# Altium footprint library 布洛电子PCB封装库-通用接插件.PcbLib: 103 footprints (part 3 of 7)
Each footprint in its own frame and in the unit in brackets; x right, y up, seen from the top. Pads: shape width x height; smd on the part's side, far side on the other; paste and mask are expansions set on the pad; w line width, h text height; cw(c..) or ccw(c..) is an arc to the next point about the centre after c.
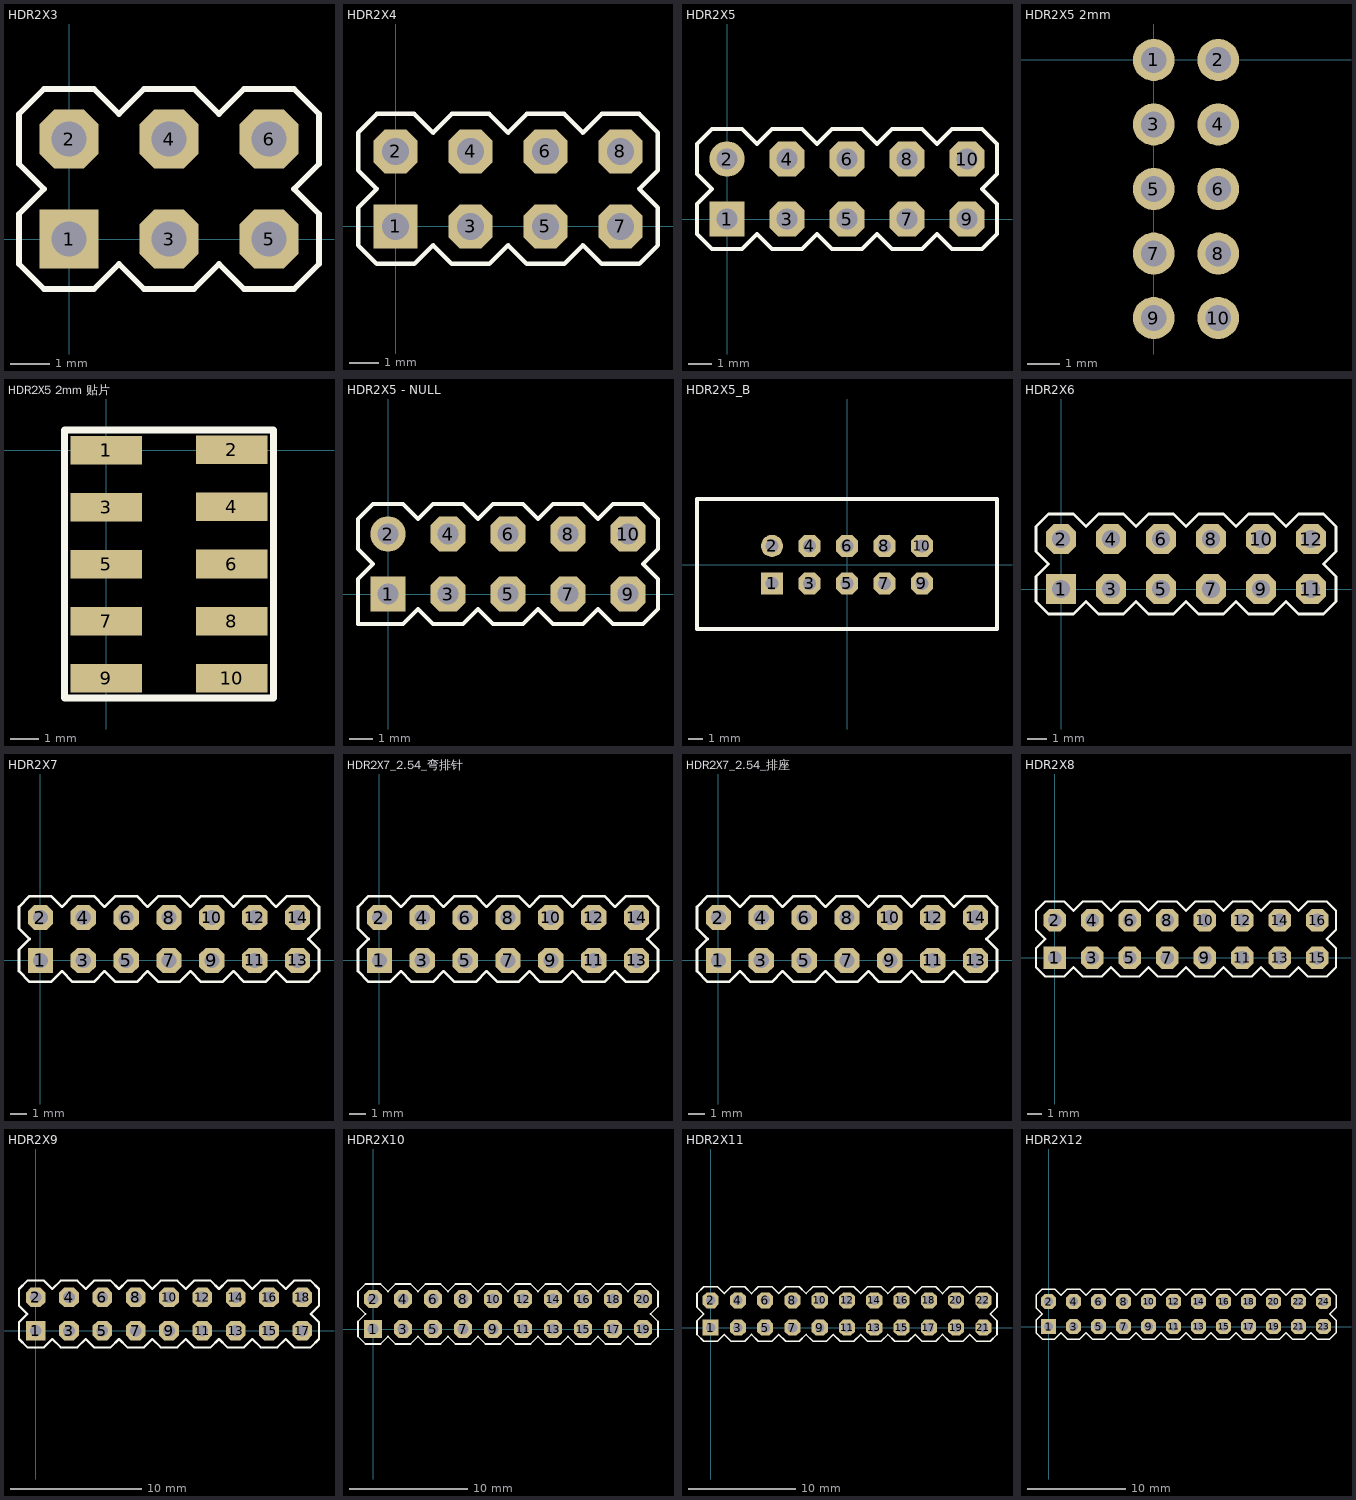
[diagram p2: the footprints below, top view; thin cyan lines are the x and y axes]

## HDR2X3 [mm] "Connector; Header; 3x2 Position"
pads (6):
  rect 1.5x1.5 hole 0.9: 1(0,0)
  oct 1.5x1.5 hole 0.9: 2(0,2.54) 3(2.54,0) 4(2.54,2.54) 5(5.08,0) 6(5.08,2.54)
Top Overlay:
  lines w0.152: -1.27,-0.635 -0.635,-1.27 0.635,-1.27 1.27,-0.635 1.905,-1.27 3.175,-1.27 3.81,-0.635 4.445,-1.27 5.715,-1.27 6.35,-0.635 6.35,0.635 5.715,1.27 6.35,1.905 6.35,3.175 5.715,3.81 4.445,3.81 3.81,3.175 3.175,3.81 1.905,3.81 1.27,3.175 0.635,3.81 -0.635,3.81 -1.27,3.175 -1.27,1.905 -0.635,1.27 -1.27,0.635 -1.27,-0.635
3D body: height 7.58, standoff -2.94, extent 1.27,1.27 3.81,3.81
3D body: height 7.58, standoff -2.94, extent -1.27,1.27 1.27,3.81
3D body: height 7.58, standoff -2.94, extent 1.27,-1.27 3.81,1.27
3D body: height 7.58, standoff -2.94, extent -1.27,-1.27 1.27,1.27
3D body: height 7.58, standoff -2.94, extent 3.81,-1.27 6.35,1.27
3D body: height 7.58, standoff -2.94, extent 3.81,1.27 6.35,3.81

## HDR2X4 [mm] "Connector; Header; 4x2 Position"
pads (8):
  rect 1.5x1.5 hole 0.9: 1(0,0)
  oct 1.5x1.5 hole 0.9: 2(0,2.54) 3(2.54,0) 4(2.54,2.54) 5(5.08,0) 6(5.08,2.54) 7(7.62,0) 8(7.62,2.54)
Top Overlay:
  lines w0.152: -1.27,-0.635 -1.27,0.635 -0.635,1.27 -1.27,1.905 -1.27,3.175 -0.635,3.81 0.635,3.81 1.27,3.175 1.905,3.81 3.175,3.81 3.81,3.175 4.445,3.81 5.715,3.81 6.35,3.175 6.985,3.81 8.255,3.81 8.89,3.175 8.89,1.905 8.255,1.27 8.89,0.635 8.89,-0.635 8.255,-1.27 6.985,-1.27 6.35,-0.635 5.715,-1.27 4.445,-1.27 3.81,-0.635 3.175,-1.27 1.905,-1.27 1.27,-0.635 0.635,-1.27 -0.635,-1.27 -1.27,-0.635
3D body: height 7.58, standoff -2.94, extent 3.81,1.27 6.35,3.81
3D body: height 7.58, standoff -2.94, extent 3.81,-1.27 6.35,1.27
3D body: height 7.58, standoff -2.94, extent -1.27,-1.27 1.27,1.27
3D body: height 7.58, standoff -2.94, extent 1.27,-1.27 3.81,1.27
3D body: height 7.58, standoff -2.94, extent -1.27,1.27 1.27,3.81
3D body: height 7.58, standoff -2.94, extent 1.27,1.27 3.81,3.81
3D body: height 7.58, standoff -2.94, extent 6.35,-1.27 8.89,1.27
3D body: height 7.58, standoff -2.94, extent 6.35,1.27 8.89,3.81

## HDR2X5 [mm] "Connector; Header; 5x2 Position"
pads (10):
  rect 1.5x1.5 hole 0.9: 1(0,0)
  round 1.5 hole 0.9: 2(0,2.54)
  oct 1.5x1.5 hole 0.9: 3(2.54,0) 4(2.54,2.54) 5(5.08,0) 6(5.08,2.54) 7(7.62,0) 8(7.62,2.54) 9(10.16,0) 10(10.16,2.54)
Top Overlay:
  lines w0.152: -1.27,-0.635 -0.635,-1.27 0.635,-1.27 1.27,-0.635 1.905,-1.27 3.175,-1.27 3.81,-0.635 4.445,-1.27 5.715,-1.27 6.35,-0.635 6.985,-1.27 8.255,-1.27 8.89,-0.635 9.525,-1.27 10.795,-1.27 11.43,-0.635 11.43,0.635 10.795,1.27 11.43,1.905 11.43,2.54 11.43,3.175 10.795,3.81 9.525,3.81 8.89,3.175 8.255,3.81 6.985,3.81 6.35,3.175 5.715,3.81 4.445,3.81 3.81,3.175 3.175,3.81 1.905,3.81 1.27,3.175 0.635,3.81 -0.635,3.81 -1.27,3.175 -1.27,1.905 -0.635,1.27 -1.27,0.635 -1.27,-0.635
3D body: height 7.58, standoff -2.94, extent 8.89,1.27 11.43,3.81
3D body: height 7.58, standoff -2.94, extent 8.89,-1.27 11.43,1.27
3D body: height 7.58, standoff -2.94, extent 6.35,1.27 8.89,3.81
3D body: height 7.58, standoff -2.94, extent 6.35,-1.27 8.89,1.27
3D body: height 7.58, standoff -2.94, extent 3.81,1.27 6.35,3.81
3D body: height 7.58, standoff -2.94, extent 3.81,-1.27 6.35,1.27
3D body: height 7.58, standoff -2.94, extent 1.27,1.27 3.81,3.81
3D body: height 7.58, standoff -2.94, extent 1.27,-1.27 3.81,1.27
3D body: height 7.58, standoff -2.94, extent -1.27,1.27 1.27,3.81
3D body: height 7.58, standoff -2.94, extent -1.27,-1.27 1.27,1.27

## HDR2X5 2mm [mm]
pads (10):
  round 1.3 hole 0.8: 1(0,0) 2(2,0) 3(0,-2) 4(2,-2) 5(0,-4) 6(2,-4) 7(0,-6) 8(2,-6) 9(0,-8) 10(2,-8)
3D body: height 6, standoff -2.8, extent -0.952,-9.014 3.048,0.886

## HDR2X5 2mm 贴片 [mm]
pads (11):
  rect 2.5x1 smd: 1(0,0) 1(0,0) 2(4.394,0.025) 3(0,-2) 4(4.394,-1.981) 5(0,-4) 6(4.394,-3.987) 7(0,-6) 8(4.394,-5.994) 9(0,-8) 10(4.394,-8)
Top Overlay:
  lines w0.254: -1.473,-8.687 -1.473,0.711 5.867,0.711 5.867,-8.687 -1.473,-8.687

## HDR2X5 - NULL [mm] "Connector; Header; 5x2 Position"
pads (10):
  rect 1.5x1.5 hole 0.9: 1(0,0)
  round 1.5 hole 0.9: 2(0,2.54)
  oct 1.5x1.5 hole 0.9: 3(2.54,0) 4(2.54,2.54) 5(5.08,0) 6(5.08,2.54) 7(7.62,0) 8(7.62,2.54) 9(10.16,0) 10(10.16,2.54)
Top Overlay:
  lines w0.152: -1.27,-1.27 -1.27,0.635 -0.635,1.27 -1.27,1.905 -1.27,3.175 -0.635,3.81 0.635,3.81 1.27,3.175 1.905,3.81 3.175,3.81 3.81,3.175 4.445,3.81 5.715,3.81 6.35,3.175 6.985,3.81 8.255,3.81 8.89,3.175 9.525,3.81 10.795,3.81 11.43,3.175 11.43,2.54 11.43,1.905 10.795,1.27 11.43,0.635 11.43,-0.635 10.795,-1.27 9.525,-1.27 8.89,-0.635 8.255,-1.27 6.985,-1.27 6.35,-0.635 5.715,-1.27 4.445,-1.27 3.81,-0.635 3.175,-1.27 1.905,-1.27 1.27,-0.635 0.635,-1.27 -1.27,-1.27

## HDR2X5_B [mm]
pads (10):
  rect 1.5x1.5 hole 0.9: 1(-5.08,-1.27)
  round 1.5 hole 0.9: 2(-5.08,1.27)
  oct 1.5x1.5 hole 0.9: 3(-2.54,-1.27) 4(-2.54,1.27) 5(0,-1.27) 6(0,1.27) 7(2.54,-1.27) 8(2.54,1.27) 9(5.08,-1.27) 10(5.08,1.27)
Top Overlay:
  lines w0.254: -10.16,-4.355 -10.16,4.445 10.16,4.445 10.16,-4.355 -10.16,-4.355
3D body: height 9.2, standoff -3.3, extent -10.16,-4.355 10.16,4.445

## HDR2X6 [mm] "Connector; Header; 6x2 Position"
pads (12):
  rect 1.5x1.5 hole 0.9: 1(0,0)
  oct 1.5x1.5 hole 0.9: 2(0,2.54) 3(2.54,0) 4(2.54,2.54) 5(5.08,0) 6(5.08,2.54) 7(7.62,0) 8(7.62,2.54) 9(10.16,0) 10(10.16,2.54) 11(12.7,0) 12(12.7,2.54)
Top Overlay:
  lines w0.152: -1.27,-0.635 -0.635,-1.27 0.635,-1.27 1.27,-0.635 1.905,-1.27 3.175,-1.27 3.81,-0.635 4.445,-1.27 5.715,-1.27 6.35,-0.635 6.985,-1.27 8.255,-1.27 8.89,-0.635 9.525,-1.27 10.795,-1.27 11.43,-0.635 12.065,-1.27 13.335,-1.27 13.97,-0.635 13.97,0.635 13.335,1.27 13.97,1.905 13.97,3.175 13.335,3.81 12.065,3.81 11.43,3.175 10.795,3.81 9.525,3.81 8.89,3.175 8.255,3.81 6.985,3.81 6.35,3.175 5.715,3.81 4.445,3.81 3.81,3.175 3.175,3.81 1.905,3.81 1.27,3.175 0.635,3.81 -0.635,3.81 -1.27,3.175 -1.27,1.905 -0.635,1.27 -1.27,0.635 -1.27,-0.635
3D body: height 7.58, standoff -2.94, extent 11.43,1.27 13.97,3.81
3D body: height 7.58, standoff -2.94, extent 11.43,-1.27 13.97,1.27
3D body: height 7.58, standoff -2.94, extent 8.89,1.27 11.43,3.81
3D body: height 7.58, standoff -2.94, extent 8.89,-1.27 11.43,1.27
3D body: height 7.58, standoff -2.94, extent 6.35,1.27 8.89,3.81
3D body: height 7.58, standoff -2.94, extent 6.35,-1.27 8.89,1.27
3D body: height 7.58, standoff -2.94, extent 3.81,1.27 6.35,3.81
3D body: height 7.58, standoff -2.94, extent 3.81,-1.27 6.35,1.27
3D body: height 7.58, standoff -2.94, extent 1.27,1.27 3.81,3.81
3D body: height 7.58, standoff -2.94, extent 1.27,-1.27 3.81,1.27
3D body: height 7.58, standoff -2.94, extent -1.27,1.27 1.27,3.81
3D body: height 7.58, standoff -2.94, extent -1.27,-1.27 1.27,1.27

## HDR2X7 [mm] "Connector; Header; 7x2 Position"
pads (14):
  rect 1.5x1.5 hole 0.9: 1(0,0)
  oct 1.5x1.5 hole 0.9: 2(0,2.54) 3(2.54,0) 4(2.54,2.54) 5(5.08,0) 6(5.08,2.54) 7(7.62,0) 8(7.62,2.54) 9(10.16,0) 10(10.16,2.54) 11(12.7,0) 12(12.7,2.54) 13(15.24,0) 14(15.24,2.54)
Top Overlay:
  lines w0.152: -1.27,-0.635 -0.635,-1.27 0.635,-1.27 1.27,-0.635 1.905,-1.27 3.175,-1.27 3.81,-0.635 4.445,-1.27 5.715,-1.27 6.35,-0.635 6.985,-1.27 8.255,-1.27 8.89,-0.635 9.525,-1.27 10.795,-1.27 11.43,-0.635 12.065,-1.27 13.335,-1.27 13.97,-0.635 14.605,-1.27 15.875,-1.27 16.51,-0.635 16.51,0.635 15.875,1.27 16.51,1.905 16.51,3.175 15.875,3.81 14.605,3.81 13.97,3.175 13.335,3.81 12.065,3.81 11.43,3.175 10.795,3.81 9.525,3.81 8.89,3.175 8.255,3.81 6.985,3.81 6.35,3.175 5.715,3.81 4.445,3.81 3.81,3.175 3.175,3.81 1.905,3.81 1.27,3.175 0.635,3.81 -0.635,3.81 -1.27,3.175 -1.27,1.905 -0.635,1.27 -1.27,0.635 -1.27,-0.635
3D body: height 7.58, standoff -2.94, extent 13.97,1.27 16.51,3.81
3D body: height 7.58, standoff -2.94, extent 13.97,-1.27 16.51,1.27
3D body: height 7.58, standoff -2.94, extent 11.43,1.27 13.97,3.81
3D body: height 7.58, standoff -2.94, extent 11.43,-1.27 13.97,1.27
3D body: height 7.58, standoff -2.94, extent 8.89,1.27 11.43,3.81
3D body: height 7.58, standoff -2.94, extent 8.89,-1.27 11.43,1.27
3D body: height 7.58, standoff -2.94, extent 6.35,1.27 8.89,3.81
3D body: height 7.58, standoff -2.94, extent 6.35,-1.27 8.89,1.27
3D body: height 7.58, standoff -2.94, extent 3.81,1.27 6.35,3.81
3D body: height 7.58, standoff -2.94, extent 3.81,-1.27 6.35,1.27
3D body: height 7.58, standoff -2.94, extent 1.27,1.27 3.81,3.81
3D body: height 7.58, standoff -2.94, extent 1.27,-1.27 3.81,1.27
3D body: height 7.58, standoff -2.94, extent -1.27,1.27 1.27,3.81
3D body: height 7.58, standoff -2.94, extent -1.27,-1.27 1.27,1.27

## HDR2X7_2.54_弯排针 [mm]
pads (14):
  rect 1.5x1.5 hole 0.9: 1(0,0)
  oct 1.5x1.5 hole 0.9: 2(0,2.54) 3(2.54,0) 4(2.54,2.54) 5(5.08,0) 6(5.08,2.54) 7(7.62,0) 8(7.62,2.54) 9(10.16,0) 10(10.16,2.54) 11(12.7,0) 12(12.7,2.54) 13(15.24,0) 14(15.24,2.54)
Top Overlay:
  lines w0.152: -1.27,-0.635 -1.27,0.635 -0.635,1.27 -1.27,1.905 -1.27,3.175 -0.635,3.81 0.635,3.81 1.27,3.175 1.905,3.81 3.175,3.81 3.81,3.175 4.445,3.81 5.715,3.81 6.35,3.175 6.985,3.81 8.255,3.81 8.89,3.175 9.525,3.81 10.795,3.81 11.43,3.175 12.065,3.81 13.335,3.81 13.97,3.175 14.605,3.81 15.875,3.81 16.51,3.175 16.51,1.905 15.875,1.27 16.51,0.635 16.51,-0.635 15.875,-1.27 14.605,-1.27 13.97,-0.635 13.335,-1.27 12.065,-1.27 11.43,-0.635 10.795,-1.27 9.525,-1.27 8.89,-0.635 8.255,-1.27 6.985,-1.27 6.35,-0.635 5.715,-1.27 4.445,-1.27 3.81,-0.635 3.175,-1.27 1.905,-1.27 1.27,-0.635 0.635,-1.27 -0.635,-1.27 -1.27,-0.635
3D body: height 5.7, standoff -3.07, extent -1.245,-10.485 16.535,2.87

## HDR2X7_2.54_排座 [mm]
pads (14):
  rect 1.5x1.5 hole 0.9: 1(0,0)
  oct 1.5x1.5 hole 0.9: 2(0,2.54) 3(2.54,0) 4(2.54,2.54) 5(5.08,0) 6(5.08,2.54) 7(7.62,0) 8(7.62,2.54) 9(10.16,0) 10(10.16,2.54) 11(12.7,0) 12(12.7,2.54) 13(15.24,0) 14(15.24,2.54)
Top Overlay:
  lines w0.152: -1.27,-0.635 -1.27,0.635 -0.635,1.27 -1.27,1.905 -1.27,3.175 -0.635,3.81 0.635,3.81 1.27,3.175 1.905,3.81 3.175,3.81 3.81,3.175 4.445,3.81 5.715,3.81 6.35,3.175 6.985,3.81 8.255,3.81 8.89,3.175 9.525,3.81 10.795,3.81 11.43,3.175 12.065,3.81 13.335,3.81 13.97,3.175 14.605,3.81 15.875,3.81 16.51,3.175 16.51,1.905 15.875,1.27 16.51,0.635 16.51,-0.635 15.875,-1.27 14.605,-1.27 13.97,-0.635 13.335,-1.27 12.065,-1.27 11.43,-0.635 10.795,-1.27 9.525,-1.27 8.89,-0.635 8.255,-1.27 6.985,-1.27 6.35,-0.635 5.715,-1.27 4.445,-1.27 3.81,-0.635 3.175,-1.27 1.905,-1.27 1.27,-0.635 0.635,-1.27 -0.635,-1.27 -1.27,-0.635
3D body: height 8.5, standoff -3.2, extent -1.393,-1.23 16.637,3.77

## HDR2X8 [mm] "Connector; Header; 8x2 Position"
pads (16):
  rect 1.5x1.5 hole 0.9: 1(0,0)
  oct 1.5x1.5 hole 0.9: 2(0,2.54) 3(2.54,0) 4(2.54,2.54) 5(5.08,0) 6(5.08,2.54) 7(7.62,0) 8(7.62,2.54) 9(10.16,0) 10(10.16,2.54) 11(12.7,0) 12(12.7,2.54) 13(15.24,0) 14(15.24,2.54) 15(17.78,0) 16(17.78,2.54)
Top Overlay:
  lines w0.152: -1.27,-0.635 -1.27,0.635 -0.635,1.27 -1.27,1.905 -1.27,3.175 -0.635,3.81 0.635,3.81 1.27,3.175 1.905,3.81 3.175,3.81 3.81,3.175 4.445,3.81 5.715,3.81 6.35,3.175 6.985,3.81 8.255,3.81 8.89,3.175 9.525,3.81 10.795,3.81 11.43,3.175 12.065,3.81 13.335,3.81 13.97,3.175 14.605,3.81 15.875,3.81 16.51,3.175 17.145,3.81 18.415,3.81 19.05,3.175 19.05,1.905 18.415,1.27 19.05,0.635 19.05,-0.635 18.415,-1.27 17.145,-1.27 16.51,-0.635 15.875,-1.27 14.605,-1.27 13.97,-0.635 13.335,-1.27 12.065,-1.27 11.43,-0.635 10.795,-1.27 9.525,-1.27 8.89,-0.635 8.255,-1.27 6.985,-1.27 6.35,-0.635 5.715,-1.27 4.445,-1.27 3.81,-0.635 3.175,-1.27 1.905,-1.27 1.27,-0.635 0.635,-1.27 -0.635,-1.27 -1.27,-0.635
3D body: height 7.58, standoff -2.94, extent -1.27,-1.27 1.27,1.27
3D body: height 7.58, standoff -2.94, extent -1.27,1.27 1.27,3.81
3D body: height 7.58, standoff -2.94, extent 1.27,-1.27 3.81,1.27
3D body: height 7.58, standoff -2.94, extent 1.27,1.27 3.81,3.81
3D body: height 7.58, standoff -2.94, extent 3.81,-1.27 6.35,1.27
3D body: height 7.58, standoff -2.94, extent 3.81,1.27 6.35,3.81
3D body: height 7.58, standoff -2.94, extent 6.35,-1.27 8.89,1.27
3D body: height 7.58, standoff -2.94, extent 6.35,1.27 8.89,3.81
3D body: height 7.58, standoff -2.94, extent 8.89,-1.27 11.43,1.27
3D body: height 7.58, standoff -2.94, extent 8.89,1.27 11.43,3.81
3D body: height 7.58, standoff -2.94, extent 11.43,-1.27 13.97,1.27
3D body: height 7.58, standoff -2.94, extent 11.43,1.27 13.97,3.81
3D body: height 7.58, standoff -2.94, extent 13.97,-1.27 16.51,1.27
3D body: height 7.58, standoff -2.94, extent 13.97,1.27 16.51,3.81
3D body: height 7.58, standoff -2.94, extent 16.51,-1.27 19.05,1.27
3D body: height 7.58, standoff -2.94, extent 16.51,1.27 19.05,3.81

## HDR2X9 [mm] "Connector; Header; 9x2 Position"
pads (18):
  rect 1.5x1.5 hole 0.9: 1(0,0)
  oct 1.5x1.5 hole 0.9: 2(0,2.54) 3(2.54,0) 4(2.54,2.54) 5(5.08,0) 6(5.08,2.54) 7(7.62,0) 8(7.62,2.54) 9(10.16,0) 10(10.16,2.54) 11(12.7,0) 12(12.7,2.54) 13(15.24,0) 14(15.24,2.54) 15(17.78,0) 16(17.78,2.54) 17(20.32,0) 18(20.32,2.54)
Top Overlay:
  lines w0.152: -1.27,-0.635 -0.635,-1.27 0.635,-1.27 1.27,-0.635 1.905,-1.27 3.175,-1.27 3.81,-0.635 4.445,-1.27 5.715,-1.27 6.35,-0.635 6.985,-1.27 8.255,-1.27 8.89,-0.635 9.525,-1.27 10.795,-1.27 11.43,-0.635 12.065,-1.27 13.335,-1.27 13.97,-0.635 14.605,-1.27 15.875,-1.27 16.51,-0.635 17.145,-1.27 18.415,-1.27 19.05,-0.635 19.685,-1.27 20.955,-1.27 21.59,-0.635 21.59,0.635 20.955,1.27 21.59,1.905 21.59,3.175 20.955,3.81 19.685,3.81 19.05,3.175 18.415,3.81 17.145,3.81 16.51,3.175 15.875,3.81 14.605,3.81 13.97,3.175 13.335,3.81 12.065,3.81 11.43,3.175 10.795,3.81 9.525,3.81 8.89,3.175 8.255,3.81 6.985,3.81 6.35,3.175 5.715,3.81 4.445,3.81 3.81,3.175 3.175,3.81 1.905,3.81 1.27,3.175 0.635,3.81 -0.635,3.81 -1.27,3.175 -1.27,1.905 -0.635,1.27 -1.27,0.635 -1.27,-0.635
3D body: height 7.58, standoff -2.94, extent -1.27,1.27 1.27,3.81
3D body: height 7.58, standoff -2.94, extent -1.27,-1.27 1.27,1.27
3D body: height 7.58, standoff -2.94, extent 1.27,1.27 3.81,3.81
3D body: height 7.58, standoff -2.94, extent 1.27,-1.27 3.81,1.27
3D body: height 7.58, standoff -2.94, extent 3.81,1.27 6.35,3.81
3D body: height 7.58, standoff -2.94, extent 3.81,-1.27 6.35,1.27
3D body: height 7.58, standoff -2.94, extent 6.35,1.27 8.89,3.81
3D body: height 7.58, standoff -2.94, extent 6.35,-1.27 8.89,1.27
3D body: height 7.58, standoff -2.94, extent 8.89,1.27 11.43,3.81
3D body: height 7.58, standoff -2.94, extent 8.89,-1.27 11.43,1.27
3D body: height 7.58, standoff -2.94, extent 11.43,1.27 13.97,3.81
3D body: height 7.58, standoff -2.94, extent 11.43,-1.27 13.97,1.27
3D body: height 7.58, standoff -2.94, extent 13.97,1.27 16.51,3.81
3D body: height 7.58, standoff -2.94, extent 13.97,-1.27 16.51,1.27
3D body: height 7.58, standoff -2.94, extent 16.51,1.27 19.05,3.81
3D body: height 7.58, standoff -2.94, extent 16.51,-1.27 19.05,1.27
3D body: height 7.58, standoff -2.94, extent 19.05,1.27 21.59,3.81
3D body: height 7.58, standoff -2.94, extent 19.05,-1.27 21.59,1.27

## HDR2X10 [mm] "Connector; Header; 10x2 Position"
pads (20):
  rect 1.5x1.5 hole 0.9: 1(0,0)
  oct 1.5x1.5 hole 0.9: 2(0,2.54) 3(2.54,0) 4(2.54,2.54) 5(5.08,0) 6(5.08,2.54) 7(7.62,0) 8(7.62,2.54) 9(10.16,0) 10(10.16,2.54) 11(12.7,0) 12(12.7,2.54) 13(15.24,0) 14(15.24,2.54) 15(17.78,0) 16(17.78,2.54) 17(20.32,0) 18(20.32,2.54) 19(22.86,0) 20(22.86,2.54)
Top Overlay:
  lines w0.152: -1.27,-0.635 -1.27,0.635 -0.635,1.27 -1.27,1.905 -1.27,3.175 -0.635,3.81 0.635,3.81 1.27,3.175 1.905,3.81 3.175,3.81 3.81,3.175 4.445,3.81 5.715,3.81 6.35,3.175 6.985,3.81 8.255,3.81 8.89,3.175 9.525,3.81 10.795,3.81 11.43,3.175 12.065,3.81 13.335,3.81 13.97,3.175 14.605,3.81 15.875,3.81 16.51,3.175 17.145,3.81 18.415,3.81 19.05,3.175 19.685,3.81 20.955,3.81 21.59,3.175 22.225,3.81 23.495,3.81 24.13,3.175 24.13,1.905 23.495,1.27 24.13,0.635 24.13,-0.635 23.495,-1.27 22.225,-1.27 21.59,-0.635 20.955,-1.27 19.685,-1.27 19.05,-0.635 18.415,-1.27 17.145,-1.27 16.51,-0.635 15.875,-1.27 14.605,-1.27 13.97,-0.635 13.335,-1.27 12.065,-1.27 11.43,-0.635 10.795,-1.27 9.525,-1.27 8.89,-0.635 8.255,-1.27 6.985,-1.27 6.35,-0.635 5.715,-1.27 4.445,-1.27 3.81,-0.635 3.175,-1.27 1.905,-1.27 1.27,-0.635 0.635,-1.27 -0.635,-1.27 -1.27,-0.635
3D body: height 7.58, standoff -2.94, extent -1.27,-1.27 1.27,1.27
3D body: height 7.58, standoff -2.94, extent -1.27,1.27 1.27,3.81
3D body: height 7.58, standoff -2.94, extent 1.27,-1.27 3.81,1.27
3D body: height 7.58, standoff -2.94, extent 1.27,1.27 3.81,3.81
3D body: height 7.58, standoff -2.94, extent 3.81,-1.27 6.35,1.27
3D body: height 7.58, standoff -2.94, extent 3.81,1.27 6.35,3.81
3D body: height 7.58, standoff -2.94, extent 6.35,-1.27 8.89,1.27
3D body: height 7.58, standoff -2.94, extent 6.35,1.27 8.89,3.81
3D body: height 7.58, standoff -2.94, extent 8.89,-1.27 11.43,1.27
3D body: height 7.58, standoff -2.94, extent 8.89,1.27 11.43,3.81
3D body: height 7.58, standoff -2.94, extent 11.43,-1.27 13.97,1.27
3D body: height 7.58, standoff -2.94, extent 11.43,1.27 13.97,3.81
3D body: height 7.58, standoff -2.94, extent 13.97,-1.27 16.51,1.27
3D body: height 7.58, standoff -2.94, extent 13.97,1.27 16.51,3.81
3D body: height 7.58, standoff -2.94, extent 16.51,-1.27 19.05,1.27
3D body: height 7.58, standoff -2.94, extent 16.51,1.27 19.05,3.81
3D body: height 7.58, standoff -2.94, extent 19.05,-1.27 21.59,1.27
3D body: height 7.58, standoff -2.94, extent 19.05,1.27 21.59,3.81
3D body: height 7.58, standoff -2.94, extent 21.59,-1.27 24.13,1.27
3D body: height 7.58, standoff -2.94, extent 21.59,1.27 24.13,3.81

## HDR2X11 [mm] "Connector; Header; 11x2 Position"
pads (22):
  rect 1.5x1.5 hole 0.9: 1(0,0)
  oct 1.5x1.5 hole 0.9: 2(0,2.54) 3(2.54,0) 4(2.54,2.54) 5(5.08,0) 6(5.08,2.54) 7(7.62,0) 8(7.62,2.54) 9(10.16,0) 10(10.16,2.54) 11(12.7,0) 12(12.7,2.54) 13(15.24,0) 14(15.24,2.54) 15(17.78,0) 16(17.78,2.54) 17(20.32,0) 18(20.32,2.54) 19(22.86,0) 20(22.86,2.54) 21(25.4,0) 22(25.4,2.54)
Top Overlay:
  lines w0.152: -1.27,-0.635 -1.27,0.635 -0.635,1.27 -1.27,1.905 -1.27,3.175 -0.635,3.81 0.635,3.81 1.27,3.175 1.905,3.81 3.175,3.81 3.81,3.175 4.445,3.81 5.715,3.81 6.35,3.175 6.985,3.81 8.255,3.81 8.89,3.175 9.525,3.81 10.795,3.81 11.43,3.175 12.065,3.81 13.335,3.81 13.97,3.175 14.605,3.81 15.875,3.81 16.51,3.175 17.145,3.81 18.415,3.81 19.05,3.175 19.685,3.81 20.955,3.81 21.59,3.175 22.225,3.81 23.495,3.81 24.13,3.175 24.765,3.81 26.035,3.81 26.67,3.175 26.67,1.905 26.035,1.27 26.67,0.635 26.67,-0.635 26.035,-1.27 24.765,-1.27 24.13,-0.635 23.495,-1.27 22.225,-1.27 21.59,-0.635 20.955,-1.27 19.685,-1.27 19.05,-0.635 18.415,-1.27 17.145,-1.27 16.51,-0.635 15.875,-1.27 14.605,-1.27 13.97,-0.635 13.335,-1.27 12.065,-1.27 11.43,-0.635 10.795,-1.27 9.525,-1.27 8.89,-0.635 8.255,-1.27 6.985,-1.27 6.35,-0.635 5.715,-1.27 4.445,-1.27 3.81,-0.635 3.175,-1.27 1.905,-1.27 1.27,-0.635 0.635,-1.27 -0.635,-1.27 -1.27,-0.635
3D body: height 7.58, standoff -2.94, extent 24.13,1.27 26.67,3.81
3D body: height 7.58, standoff -2.94, extent 24.13,-1.27 26.67,1.27
3D body: height 7.58, standoff -2.94, extent 21.59,1.27 24.13,3.81
3D body: height 7.58, standoff -2.94, extent 21.59,-1.27 24.13,1.27
3D body: height 7.58, standoff -2.94, extent 19.05,1.27 21.59,3.81
3D body: height 7.58, standoff -2.94, extent 19.05,-1.27 21.59,1.27
3D body: height 7.58, standoff -2.94, extent 16.51,1.27 19.05,3.81
3D body: height 7.58, standoff -2.94, extent 16.51,-1.27 19.05,1.27
3D body: height 7.58, standoff -2.94, extent 13.97,1.27 16.51,3.81
3D body: height 7.58, standoff -2.94, extent 13.97,-1.27 16.51,1.27
3D body: height 7.58, standoff -2.94, extent 11.43,1.27 13.97,3.81
3D body: height 7.58, standoff -2.94, extent 11.43,-1.27 13.97,1.27
3D body: height 7.58, standoff -2.94, extent 8.89,1.27 11.43,3.81
3D body: height 7.58, standoff -2.94, extent 8.89,-1.27 11.43,1.27
3D body: height 7.58, standoff -2.94, extent 6.35,1.27 8.89,3.81
3D body: height 7.58, standoff -2.94, extent 6.35,-1.27 8.89,1.27
3D body: height 7.58, standoff -2.94, extent 3.81,1.27 6.35,3.81
3D body: height 7.58, standoff -2.94, extent 3.81,-1.27 6.35,1.27
3D body: height 7.58, standoff -2.94, extent 1.27,1.27 3.81,3.81
3D body: height 7.58, standoff -2.94, extent 1.27,-1.27 3.81,1.27
3D body: height 7.58, standoff -2.94, extent -1.27,1.27 1.27,3.81
3D body: height 7.58, standoff -2.94, extent -1.27,-1.27 1.27,1.27

## HDR2X12 [mm] "Connector; Header; 12x2 Position"
pads (24):
  rect 1.5x1.5 hole 0.9: 1(0,0)
  oct 1.5x1.5 hole 0.9: 2(0,2.54) 3(2.54,0) 4(2.54,2.54) 5(5.08,0) 6(5.08,2.54) 7(7.62,0) 8(7.62,2.54) 9(10.16,0) 10(10.16,2.54) 11(12.7,0) 12(12.7,2.54) 13(15.24,0) 14(15.24,2.54) 15(17.78,0) 16(17.78,2.54) 17(20.32,0) 18(20.32,2.54) 19(22.86,0) 20(22.86,2.54) 21(25.4,0) 22(25.4,2.54) 23(27.94,0) 24(27.94,2.54)
Top Overlay:
  lines w0.152: -1.27,-0.635 -1.27,0.635 -0.635,1.27 -1.27,1.905 -1.27,3.175 -0.635,3.81 0.635,3.81 1.27,3.175 1.905,3.81 3.175,3.81 3.81,3.175 4.445,3.81 5.715,3.81 6.35,3.175 6.985,3.81 8.255,3.81 8.89,3.175 9.525,3.81 10.795,3.81 11.43,3.175 12.065,3.81 13.335,3.81 13.97,3.175 14.605,3.81 15.875,3.81 16.51,3.175 17.145,3.81 18.415,3.81 19.05,3.175 19.685,3.81 20.955,3.81 21.59,3.175 22.225,3.81 23.495,3.81 24.13,3.175 24.765,3.81 26.035,3.81 26.67,3.175 27.305,3.81 28.575,3.81 29.21,3.175 29.21,1.905 28.575,1.27 29.21,0.635 29.21,-0.635 28.575,-1.27 27.305,-1.27 26.67,-0.635 26.035,-1.27 24.765,-1.27 24.13,-0.635 23.495,-1.27 22.225,-1.27 21.59,-0.635 20.955,-1.27 19.685,-1.27 19.05,-0.635 18.415,-1.27 17.145,-1.27 16.51,-0.635 15.875,-1.27 14.605,-1.27 13.97,-0.635 13.335,-1.27 12.065,-1.27 11.43,-0.635 10.795,-1.27 9.525,-1.27 8.89,-0.635 8.255,-1.27 6.985,-1.27 6.35,-0.635 5.715,-1.27 4.445,-1.27 3.81,-0.635 3.175,-1.27 1.905,-1.27 1.27,-0.635 0.635,-1.27 -0.635,-1.27 -1.27,-0.635
3D body: height 7.58, standoff -2.94, extent -1.27,-1.27 1.27,1.27
3D body: height 7.58, standoff -2.94, extent -1.27,1.27 1.27,3.81
3D body: height 7.58, standoff -2.94, extent 1.27,-1.27 3.81,1.27
3D body: height 7.58, standoff -2.94, extent 1.27,1.27 3.81,3.81
3D body: height 7.58, standoff -2.94, extent 3.81,-1.27 6.35,1.27
3D body: height 7.58, standoff -2.94, extent 3.81,1.27 6.35,3.81
3D body: height 7.58, standoff -2.94, extent 6.35,-1.27 8.89,1.27
3D body: height 7.58, standoff -2.94, extent 6.35,1.27 8.89,3.81
3D body: height 7.58, standoff -2.94, extent 8.89,-1.27 11.43,1.27
3D body: height 7.58, standoff -2.94, extent 8.89,1.27 11.43,3.81
3D body: height 7.58, standoff -2.94, extent 11.43,-1.27 13.97,1.27
3D body: height 7.58, standoff -2.94, extent 11.43,1.27 13.97,3.81
3D body: height 7.58, standoff -2.94, extent 13.97,-1.27 16.51,1.27
3D body: height 7.58, standoff -2.94, extent 13.97,1.27 16.51,3.81
3D body: height 7.58, standoff -2.94, extent 16.51,-1.27 19.05,1.27
3D body: height 7.58, standoff -2.94, extent 16.51,1.27 19.05,3.81
3D body: height 7.58, standoff -2.94, extent 19.05,-1.27 21.59,1.27
3D body: height 7.58, standoff -2.94, extent 19.05,1.27 21.59,3.81
3D body: height 7.58, standoff -2.94, extent 21.59,-1.27 24.13,1.27
3D body: height 7.58, standoff -2.94, extent 21.59,1.27 24.13,3.81
3D body: height 7.58, standoff -2.94, extent 24.13,-1.27 26.67,1.27
3D body: height 7.58, standoff -2.94, extent 24.13,1.27 26.67,3.81
3D body: height 7.58, standoff -2.94, extent 26.67,-1.27 29.21,1.27
3D body: height 7.58, standoff -2.94, extent 26.67,1.27 29.21,3.81